# Altium footprint library connectors_micromatch.PcbLib: 36 footprints (part 3 of 3)
Each footprint in its own frame and in the unit in brackets; x right, y up, seen from the top. Pads: shape width x height; smd on the part's side, far side on the other; paste and mask are expansions set on the pad; w line width, h text height; cw(c..) or ccw(c..) is an arc to the next point about the centre after c.
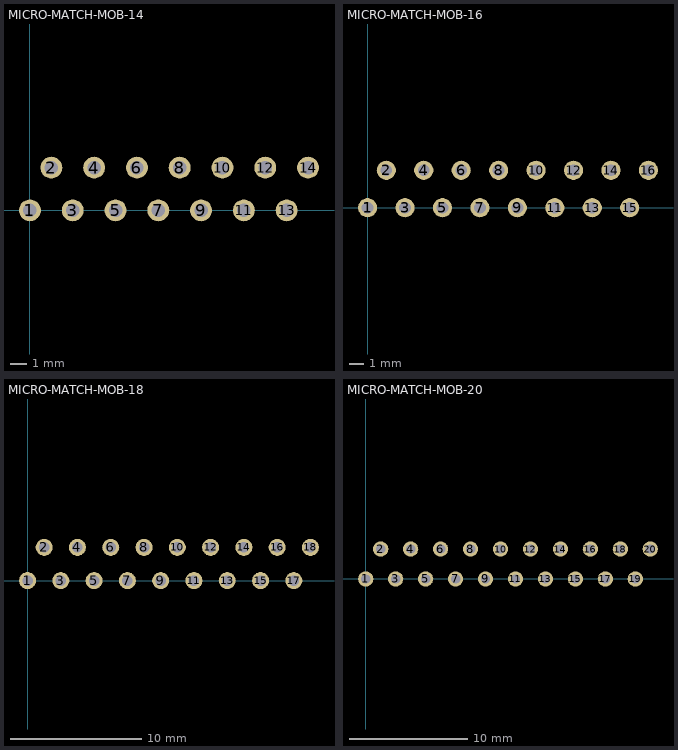
[diagram p2: the footprints below, top view; thin cyan lines are the x and y axes]

## MICRO-MATCH-MOB-14 [mm]
height 4
pads (14):
  round 1.3 hole 0.8: 1(0,0) 2(1.27,2.54) 3(2.54,0) 4(3.81,2.54) 5(5.08,0) 6(6.35,2.54) 7(7.62,0) 8(8.89,2.54) 9(10.16,0) 10(11.43,2.54) 11(12.7,0) 12(13.97,2.54) 13(15.24,0) 14(16.51,2.54)
3D body "micromatch_mob_14.STEP": height 6.9, standoff -3.1, extent -2.225,-1.228 18.735,3.772

## MICRO-MATCH-MOB-16 [mm]
height 4
pads (16):
  round 1.3 hole 0.8: 1(0,0) 2(1.27,2.54) 3(2.54,0) 4(3.81,2.54) 5(5.08,0) 6(6.35,2.54) 7(7.62,0) 8(8.89,2.54) 9(10.16,0) 10(11.43,2.54) 11(12.7,0) 12(13.97,2.54) 13(15.24,0) 14(16.51,2.54) 15(17.78,0) 16(19.05,2.54)
3D body "micromatch_mob_16.STEP": height 6.9, standoff -3.1, extent -2.225,-1.228 21.275,3.772

## MICRO-MATCH-MOB-18 [mm]
height 4
pads (18):
  round 1.3 hole 0.8: 1(0,0) 2(1.27,2.54) 3(2.54,0) 4(3.81,2.54) 5(5.08,0) 6(6.35,2.54) 7(7.62,0) 8(8.89,2.54) 9(10.16,0) 10(11.43,2.54) 11(12.7,0) 12(13.97,2.54) 13(15.24,0) 14(16.51,2.54) 15(17.78,0) 16(19.05,2.54) 17(20.32,0) 18(21.59,2.54)
3D body "micromatch_mob_18.STEP": height 6.9, standoff -3.1, extent -2.225,-1.228 23.815,3.772

## MICRO-MATCH-MOB-20 [mm]
height 4
pads (20):
  round 1.3 hole 0.8: 1(0,0) 2(1.27,2.54) 3(2.54,0) 4(3.81,2.54) 5(5.08,0) 6(6.35,2.54) 7(7.62,0) 8(8.89,2.54) 9(10.16,0) 10(11.43,2.54) 11(12.7,0) 12(13.97,2.54) 13(15.24,0) 14(16.51,2.54) 15(17.78,0) 16(19.05,2.54) 17(20.32,0) 18(21.59,2.54) 19(22.86,0) 20(24.13,2.54)
3D body "micromatch_mob_20.STEP": height 6.9, standoff -3.1, extent -2.225,-1.228 26.355,3.772